# Altium footprint library AltiumLibraries.PcbLib: 247 footprints (part 3 of 16)
Each footprint in its own frame and in the unit in brackets; x right, y up, seen from the top. Pads: shape width x height; smd on the part's side, far side on the other; paste and mask are expansions set on the pad; w line width, h text height; cw(c..) or ccw(c..) is an arc to the next point about the centre after c.
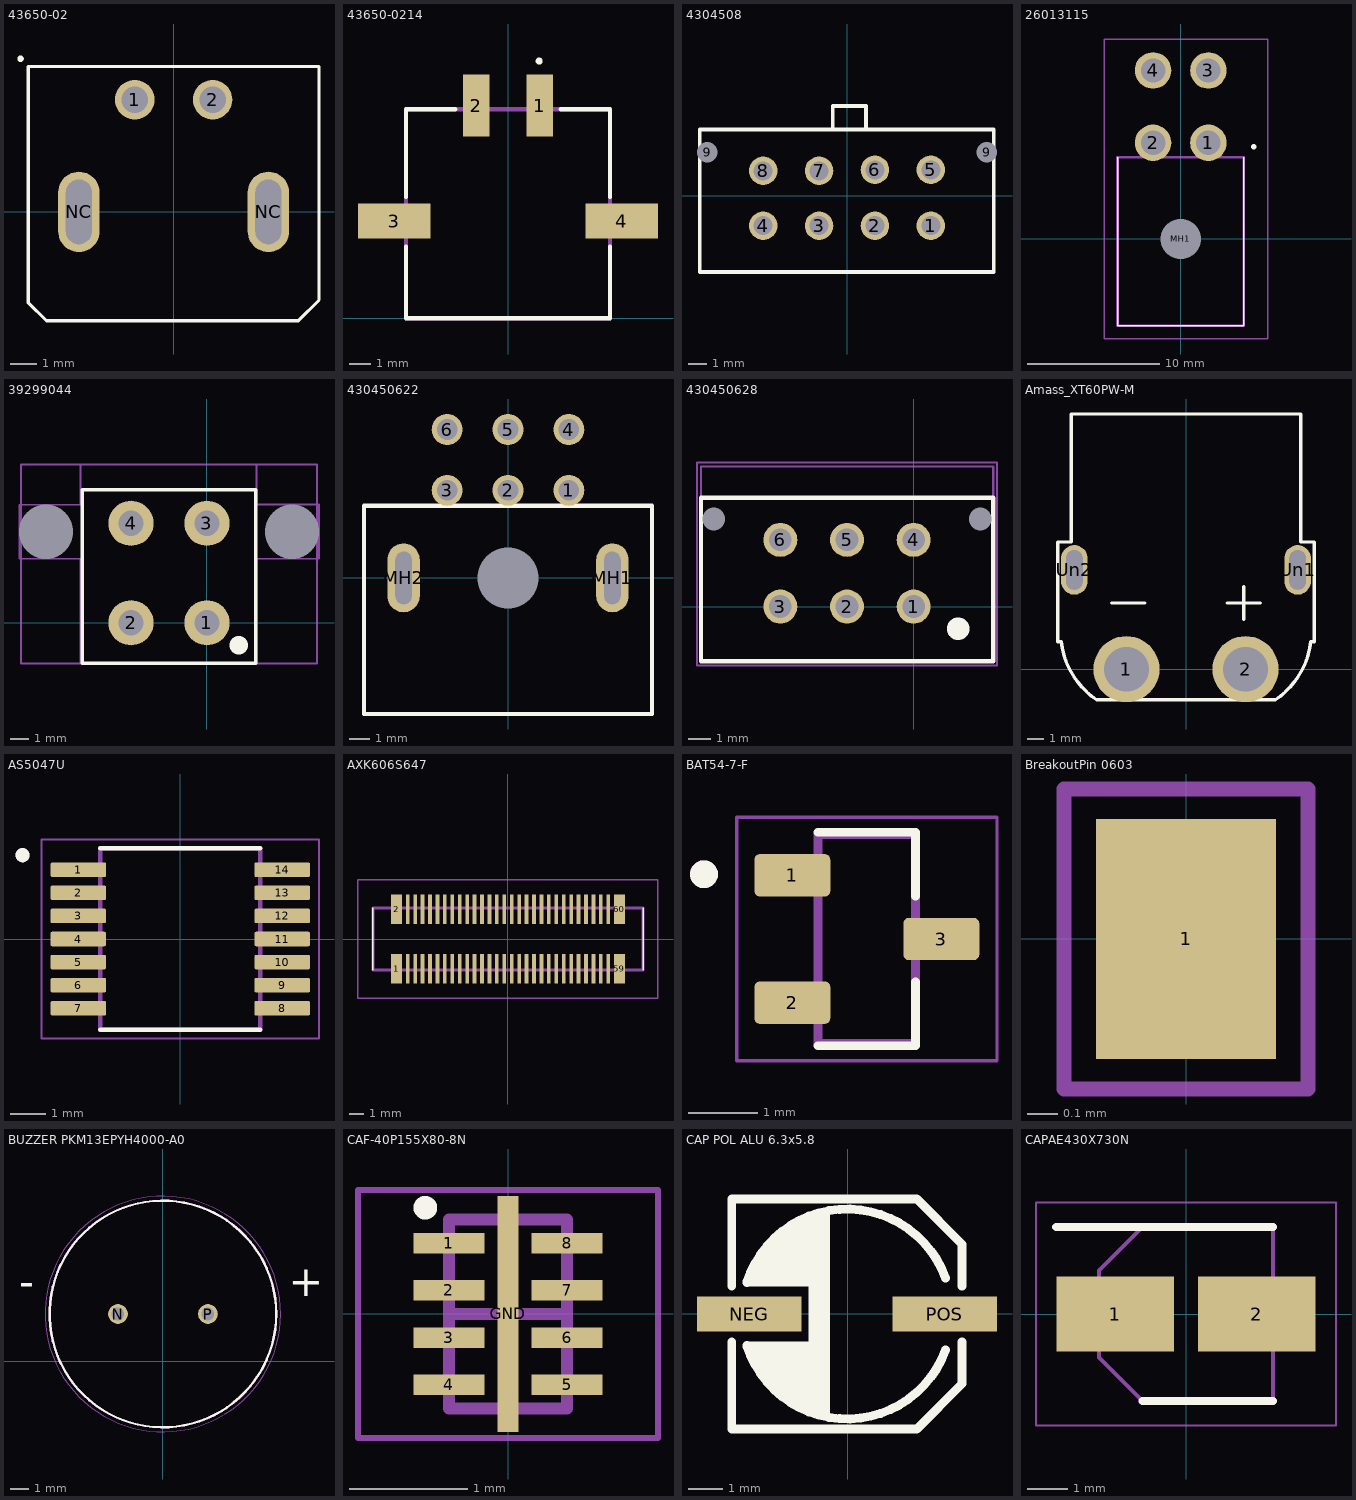
[diagram p2: the footprints below, top view; thin cyan lines are the x and y axes]

## 43650-02 [mm] "Molex Microfit 2PIN RightAngle Thru"
pads (4):
  round 1.52 hole 1.02: 1(-1.5,4.32) 2(1.5,4.32)
  oval 1.6x3.1 hole 1 slot 2.49 at 90 deg: NC(-3.65,0) NC(3.65,0)
Top Overlay:
  circle w0.127: c-5.9,5.9 r0.06
  lines w0.127: -5.6,-3.5 -5.6,5.6 5.6,5.6 5.6,-2.413 5.6,-3.4 4.8,-4.2 -4.9,-4.2 -5.6,-3.5
3D body "436500205.stp": height 2.7, standoff -6.08, extent -4.825,-4.55 4.825,5.35

## 43650-0214 [mm]
pads (4):
  rect 1.27x2.92 smd: 1(1.5,10.07) 2(-1.5,10.07)
  rect 3.43x1.65 smd: 3(-5.385,4.6) 4(5.385,4.6)
Top Overlay:
  circle w0.2: c1.476,12.178 r0.065
  lines w0.2: -4.825,3.4 -4.825,0 4.825,0 4.825,3.4 ; -4.825,5.747 -4.825,9.9 -2.494,9.9 ; 2.494,9.9 4.825,9.9 4.825,5.747
Mechanical 13:
  lines w0.2: -4.825,0 -4.825,9.9 4.825,9.9 4.825,0 -4.825,0
3D body "43650-0214.stp": height 5.68, standoff 0, extent -6.825,0.05 6.825,10.79

## 4304508 [mm] "CN Vertical 8 Pin TH"
pads (10):
  round 1.53 hole 1.02: 1(4.5,-1.602) 2(1.5,-1.602) 3(-1.5,-1.602) 4(-4.5,-1.602) 5(4.5,1.398) 6(1.5,1.398) 7(-1.5,1.344) 8(-4.5,1.344)
  round 0.9 hole 1.1: 9(-7.5,2.344) 9(7.5,2.344)
Top Overlay:
  lines w0.203: -0.762,3.556 -0.762,4.826 1.016,4.826 1.016,3.556 ; -7.899,-4.089 -7.899,3.556 7.874,3.556 7.874,-4.089 -7.899,-4.089
3D body "430450812.stp": height 9.95, standoff -3.14, extent -8.075,-4.04 8.075,4.73

## 26013115 [mm]
pads (5):
  round 2.775 hole 1.85: 1(2.1,7.3) 2(-2.1,7.3) 3(2.1,12.8) 4(-2.1,12.8)
  round 1.525 hole 3.05 unplated: MH1(0,0)
Top Overlay:
  lines w0.1: -4.8,6.2 -4.8,-6.6 4.8,-6.6 4.8,6.2
  lines w0.3: 5.5,7 ccw(c5.55,7) 5.6,7 ccw(c5.55,7) 5.5,7
Mechanical 13:
  lines w0.2: -4.8,-6.6 4.8,-6.6 4.8,6.2 -4.8,6.2 -4.8,-6.6
Mechanical 15:
  lines w0.1: -5.8,-7.6 6.6,-7.6 6.6,15.188 -5.8,15.188 -5.8,-7.6
3D body "26013115.stp": height 11.5, standoff -3.5, extent -4.8,-6.5 5.2,13.435

## 39299044 [mm] "4 POS MOLEX VERT"
pads (6):
  round 2.5 hole 1.4: 1(0,0) 2(-4.2,0) 3(0,5.5) 4(-4.2,5.5)
  round 0 hole 3 unplated: MH1(-8.9,5.04) MH1(4.7,5.04)
Top Overlay:
  circle w1: c1.75,-1.25 r0.01
  lines w0.2: -6.9,-2.25 -6.9,7.35 2.7,7.35 2.7,-2.25 -6.9,-2.25
Mechanical 13:
  lines w0.1: -10.289,-2.25 -10.289,8.75 6.089,8.75 6.089,-2.25 -10.289,-2.25
Mechanical 15:
  lines w0.1: -10.369,3.54 -10.369,5.119 -10.369,6.529 -7,6.529 -7,8.75 2.75,8.75 2.75,6.54 6.2,6.54 6.2,3.54 2.75,3.54 2.75,-2.25 -7,-2.25 -7,3.54 -10.369,3.54
3D body "039299044.stp": height 12.8, standoff -3.5, extent -10.289,-2.25 6.089,8.75

## 430450622 [mm] "6 POS RA MOLEX"
pads (9):
  round 1.53 hole 1.02: 1(3,4.32) 2(0,4.32) 3(-3,4.32) 4(3,7.32) 5(0,7.32) 6(-3,7.32)
  round 0 hole 3: MH(0,0)
  oval 1.6x3.4 hole 0.8 slot 2.6 at 90 deg: MH1(5.15,0) MH2(-5.15,0)
Top Overlay:
  lines w0.203: -7.112,-6.714 7.112,-6.714 7.112,3.556 -7.112,3.556 -7.112,-6.714
3D body "430450622.stp": height 3.12, standoff -8.83, extent -6.625,-4.655 6.575,7.585

## 430450628 [mm] "6 POS VERT MOLEX"
pads (8):
  round 1.53 hole 1.02: 1(0,0) 2(-3,0) 3(-6,0) 4(0,3) 5(-3,3) 6(-6,3)
  round 0 hole 1.02 unplated: MH1(3,3.94) MH2(-9,3.94)
Top Overlay:
  circle w1: c2,-1 r0.01
  lines w0.2: -9.57,-2.47 3.58,-2.47 3.58,4.9 -9.57,4.9 -9.57,-2.47
Mechanical 13:
  lines w0.1: -9.57,-2.47 -9.57,6.3 3.58,6.3 3.58,-2.47 -9.57,-2.47
Mechanical 15:
  lines w0.1: -9.75,-2.65 -9.75,6.48 3.75,6.48 3.75,-2.65 -9.75,-2.65
3D body "430450628.stp": height 9.95, standoff -3.14, extent -9.57,-2.47 3.58,6.3

## Amass_XT60PW-M [mm] "Right angle XT60 Male Socket"
pads (4):
  round 4 hole 2.7: 1(-3.6,0) 2(3.6,0)
  rrect100% 1.6x3 hole 1 slot 2.4 at 90 deg: Un1(6.75,6) Un2(-6.75,6)
Top Overlay:
  lines w0.2: -4.5,4 -2.5,4 ; 2.5,4 4.5,4 ; 3.5,3 3.5,5 ; -7.757,1.662 -7.543,1.662 ccw(c-2.619,2.247) -5.413,-1.85 0,-1.85 5.413,-1.85 ccw(c2.619,2.247) 7.543,1.662 7.757,1.662 7.757,7.682 6.941,7.682 6.941,15.424 0,15.424 -6.941,15.424 -6.941,7.682 -7.757,7.682 -7.757,1.662
3D body "AMASS_XT60PW_M.STEP": height 8.4, standoff -2.26, extent -7.95,-1.95 7.95,16.3

## AS5047U [mm]
pads (14):
  rrect25% 1.57x0.41 smd: 1(-2.87,1.95) 2(-2.87,1.3) 3(-2.87,0.65) 4(-2.87,0) 5(-2.87,-0.65) 6(-2.87,-1.3) 7(-2.87,-1.95) 8(2.87,-1.95) 9(2.87,-1.3) 10(2.87,-0.65) 11(2.87,0) 12(2.87,0.65) 13(2.87,1.3) 14(2.87,1.95)
Top Overlay:
  circle w0.2: c-4.44,2.36 r0.1
  lines w0.127: -2.25,-2.55 2.25,-2.55 ; -2.25,2.55 2.25,2.55
Mechanical 13:
  circle w0.2: c-4.44,2.36 r0.1
  lines w0.127: -2.25,-2.55 2.25,-2.55 2.25,2.55 -2.25,2.55 -2.25,-2.55
Mechanical 15:
  lines w0.05: -3.905,-2.8 3.905,-2.8 3.905,2.8 -3.905,2.8 -3.905,-2.8

## AXK606S647 [mm] "RS14100_WIFI_CONN"
pads (60):
  rect 0.75x2 smd: 1(-7.5,-2) 2(-7.5,2) 59(7.5,-2) 60(7.5,2)
  rect 0.25x2 smd: 3(-6.75,-2) 4(-6.75,2) 5(-6.25,-2) 6(-6.25,2) 7(-5.75,-2) 8(-5.75,2) 9(-5.25,-2) 10(-5.25,2) 11(-4.75,-2) 12(-4.75,2) 13(-4.25,-2) 14(-4.25,2) 15(-3.75,-2) 16(-3.75,2) 17(-3.25,-2) 18(-3.25,2) 19(-2.75,-2) 20(-2.75,2) 21(-2.25,-2) 22(-2.25,2) 23(-1.75,-2) 24(-1.75,2) 25(-1.25,-2) 26(-1.25,2) 27(-0.75,-2) 28(-0.75,2) 29(-0.25,-2) 30(-0.25,2) 31(0.25,-2) 32(0.25,2) 33(0.75,-2) 34(0.75,2) 35(1.25,-2) 36(1.25,2) 37(1.75,-2) 38(1.75,2) 39(2.25,-2) 40(2.25,2) 41(2.75,-2) 42(2.75,2) 43(3.25,-2) 44(3.25,2) 45(3.75,-2) 46(3.75,2) 47(4.25,-2) 48(4.25,2) 49(4.75,-2) 50(4.75,2) 51(5.25,-2) 52(5.25,2) 53(5.75,-2) 54(5.75,2) 55(6.25,-2) 56(6.25,2) 57(6.75,-2) 58(6.75,2)
Top Overlay:
  lines w0.1: -9.1,-2.1 -9.1,2.1 ; 9.1,-2.1 9.1,2.1
Mechanical 13:
  lines w0.2: -9.1,-2.1 -9.1,2.1 9.1,2.1 9.1,-2.1 -9.1,-2.1
Mechanical 15:
  lines w0.1: -10.1,-4 -10.1,4 10.1,4 10.1,-4 -10.1,-4
3D body "AXK6S60647YG.stp": height 5.6, standoff 0, extent -9.1,-2.975 9.1,2.975

## BAT54-7-F [mm]
pads (3):
  rrect25% 1.09x0.61 smd: 1(-153.343,174.051) 2(-153.343,172.221) 3(-151.203,173.136)
Top Overlay:
  circle w0.2: c-154.613,174.066 r0.1
  lines w0.127: -152.973,171.602 -151.573,171.602 -151.573,172.517 ; -152.973,174.67 -151.573,174.67 -151.573,173.755
Mechanical 13:
  circle w0.2: c-154.613,174.066 r0.1
  lines w0.127: -152.973,171.636 -152.973,174.636 -151.573,174.636 -151.573,171.636 -152.973,171.636
Mechanical 15:
  lines w0.05: -154.143,171.386 -150.403,171.386 -150.403,174.886 -154.143,174.886 -154.143,171.386

## BreakoutPin 0603 [mm] "Exposed 0603 pad for IC breakouts"
height 0.6
pads (1):
  rect 0.6x0.8 smd mask+0.1: 1(0,0)
Mechanical 15:
  lines w0.05: -0.406,-0.5 -0.406,0.5 0.406,0.5 0.406,-0.5 -0.406,-0.5

## BUZZER PKM13EPYH4000-A0 [mm]
pads (2):
  round 1.1 hole 0.7: N(-2.488,2.63) P(2.512,2.63)
Top Overlay:
  circle w0.127: c0.012,2.63 r6.3
  text "-" at -7.988,3.63 h1.68
  text "+" at 7.012,3.63 h1.68
Mechanical 13:
  circle w0.127: c0.012,2.63 r6.3
  text "-" at -7.988,3.63 h1.68
  text "+" at 7.012,3.63 h1.68
Mechanical 15:
  circle w0.05: c0.012,2.63 r6.55

## CAF-40P155X80-8N [mm] "Chip Array, Flat, 8-Leads, Pitch 0.40mm,  Body 1.55x0.80mm,  IPC Medium Density"
height 0.6
pads (9):
  rect 0.6x0.175 smd: 1(-0.5,0.6) 2(-0.5,0.2) 3(-0.5,-0.2) 4(-0.5,-0.6) 5(0.5,-0.6) 6(0.5,-0.2) 7(0.5,0.2) 8(0.5,0.6)
  rect 0.175x2 smd: GND(0,0)
Top Overlay:
  circle w0.1: c-0.7,0.9 r0.05
Mechanical 13:
  lines w0.1: -0.5,-0.8 -0.5,0.8 0.5,0.8 0.5,-0.8 -0.5,-0.8
Mechanical 15:
  lines w0.05: -1.27,-1.05 -1.27,1.05 1.27,1.05 1.27,-1.05 -1.27,-1.05
  lines w0.1: -0.5,0 0.5,0 ; 0,-0.5 0,0.5
3D body: height 0.6, standoff 0, extent -0.45,-0.8 0.45,0.8

## CAP POL ALU 6.3x5.8 [mm]
pads (2):
  rect 3x1 smd: NEG(-2.818,-0.003) POS(2.782,-0.003)
Top Overlay:
  region: -0.518,2.997 -0.518,-2.903 -0.518,-3.003 -0.518,-2.903 -1.118,-2.803 -1.618,-2.603 -1.918,-2.303 -2.218,-2.103 -2.518,-1.803 -2.718,-1.403 -2.918,-0.803 -1.118,-0.803 -1.118,0.797 -2.918,0.797 -2.818,0.997 -2.718,1.397 -2.418,1.697 -2.218,2.097 -1.818,2.397 -1.418,2.597 -1.018,2.797
  lines w0.254: -3.32,-0.803 -3.32,-3.302 1.978,-3.302 3.279,-2.002 3.279,-0.803 ; -3.32,0.797 -3.32,3.297 1.978,3.297 3.279,1.996 3.279,0.797 ; -2.887,-0.907 ccw(c-0.018,-0.003) 2.809,-1.031 ; -2.887,0.902 cw(c-0.018,-0.002) 2.809,1.026
3D body "User Library-ALU-D.STEP": height 5.4, standoff 0, extent -3.5,-3.3 3.5,3.3

## CAPAE430X730N [mm]
pads (2):
  rect 2.9x1.85 smd: 1(-1.75,0) 2(1.75,0)
Top Overlay:
  lines w0.2: -3.2,2.15 2.15,2.15 ; -1.075,-2.15 2.15,-2.15
Mechanical 13:
  lines w0.1: -2.15,-1.075 -1.075,-2.15 2.15,-2.15 2.15,2.15 -1.075,2.15 -2.15,1.075 -2.15,-1.075
Mechanical 15:
  lines w0.05: -3.7,-2.75 -3.7,2.75 3.7,2.75 3.7,-2.75 -3.7,-2.75
3D body "UCB1V0R1MCL1GS.stp": height 7.3, standoff 0, extent -2.5,-2.25 2.5,2.25